# Altium schematic symbol library Capacitor - Aluminium TH.SchLib: 4591 symbols (part 4 of 27)
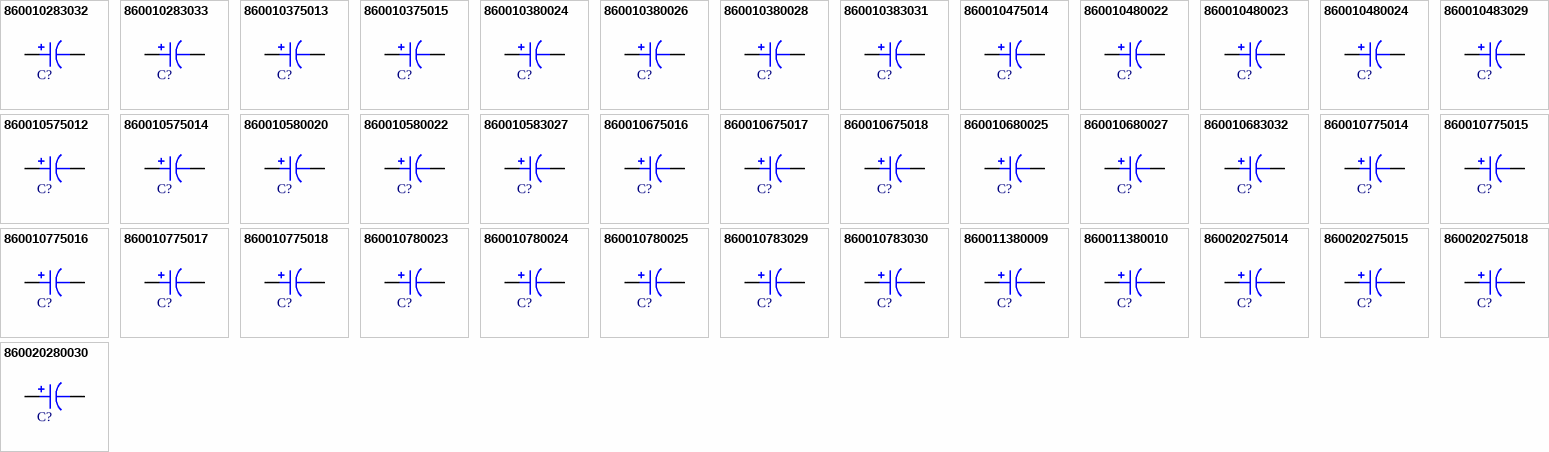
[diagram p117: symbols 860010283032 to 860020280030]

## 860010480022
designator C?, comment 2700uF  (value not drawn)
CAP 2700 UF 20% 25 V; Part Number: 860010480022; Manufacturer: Wurth Electronics Inc; TemperatureRange: -40C ~ 85C; Voltage: 25V; Type: Polar; Ripple Current: 1.804A @ 120Hz; Value: 2700uF; PartId: 26546; Supplier 1: Digi-Key; Supplier Part Number 1: 732-8645-3-ND; ComponentLink1Description: Datasheet; ComponentLink1URL: http://katalog.we-online.de/pbs/datasheet/860010480022.pdf; ComponentLink2Description: Digi-Key Listing; ComponentLink2URL: https://www.digikey.com/product-detail/en/wurth-electronics-inc/860010480022/732-8645-3-ND/5726893; Tolerance: 20%; Price: 1.0368; Device Package: Radial, Can, 16mm
footprint CAP AL TH D16 L7.5 H26.5
pins: 1, 2

## 860010480023
designator C?, comment 3300uF  (value not drawn)
CAP 3300 UF 20% 25 V; Part Number: 860010480023; Manufacturer: Wurth Electronics Inc; TemperatureRange: -40C ~ 85C; Voltage: 25V; Type: Polar; Ripple Current: 1.87A @ 120Hz; Value: 3300uF; PartId: 26547; Supplier 1: Digi-Key; Supplier Part Number 1: 732-8646-3-ND; ComponentLink1Description: Datasheet; ComponentLink1URL: http://katalog.we-online.de/pbs/datasheet/860010480023.pdf; ComponentLink2Description: Digi-Key Listing; ComponentLink2URL: https://www.digikey.com/product-detail/en/wurth-electronics-inc/860010480023/732-8646-3-ND/5726894; Tolerance: 20%; Price: 1.0397; Device Package: Radial, Can, 16mm
footprint CAP AL TH D16 L7.5 H26.5
pins: 1, 2

## 860010480024
designator C?, comment 3900uF  (value not drawn)
CAP 3900 UF 20% 25 V; Part Number: 860010480024; Manufacturer: Wurth Electronics Inc; TemperatureRange: -40C ~ 85C; Voltage: 25V; Type: Polar; Ripple Current: 2.343A @ 120Hz; Value: 3900uF; PartId: 27003; Supplier 1: Digi-Key; Supplier Part Number 1: 732-8647-3-ND; ComponentLink1Description: Datasheet; ComponentLink1URL: http://katalog.we-online.de/pbs/datasheet/860010480024.pdf; ComponentLink2Description: Digi-Key Listing; ComponentLink2URL: https://www.digikey.com/product-detail/en/wurth-electronics-inc/860010480024/732-8647-3-ND/5726895; Tolerance: 20%; Price: 1.3564; Device Package: Radial, Can, 16mm
footprint CAP AL TH D16 L7.5 H33.5
pins: 1, 2

## 860010483029
designator C?, comment 10000uF  (value not drawn)
CAP 10000 UF 20% 25 V; Part Number: 860010483029; Manufacturer: Wurth Electronics Inc; TemperatureRange: -40C ~ 85C; Voltage: 25V; Type: Polar; Ripple Current: 3.96A @ 120Hz; Value: 10000uF; PartId: 27598; Supplier 1: Digi-Key; Supplier Part Number 1: 732-8652-ND; ComponentLink1Description: Datasheet; ComponentLink1URL: http://katalog.we-online.de/pbs/datasheet/860010483029.pdf; ComponentLink2Description: Digi-Key Listing; ComponentLink2URL: https://www.digikey.com/product-detail/en/wurth-electronics-inc/860010483029/732-8652-ND/5728189; Tolerance: 20%; Price: 5.68; Device Package: Radial, Can, 22mm
footprint CAP AL TH D22 L10 H43
pins: 1, 2

## 860010575012
designator C?, comment 330uF  (value not drawn)
CAP 330 UF 20% 35 V; Part Number: 860010575012; Manufacturer: Wurth Electronics Inc; TemperatureRange: -40C ~ 85C; Voltage: 35V; Type: Polar; Ripple Current: 528mA @ 120Hz; Value: 330uF; PartId: 24732; Supplier 1: Digi-Key; Supplier Part Number 1: 732-8742-1-ND; ComponentLink1Description: Datasheet; ComponentLink1URL: http://katalog.we-online.de/pbs/datasheet/860010575012.pdf; ComponentLink2Description: Digi-Key Listing; ComponentLink2URL: https://www.digikey.com/product-detail/en/wurth-electronics-inc/860010575012/732-8742-1-ND/5728691; Tolerance: 20%; Price: 0.41; Device Package: Radial, Can, 10mm
footprint CAP AL TH D10 L5 H14.5
pins: 1, 2

## 860010575014
designator C?, comment 560uF  (value not drawn)
CAP 560 UF 20% 35 V; Part Number: 860010575014; Manufacturer: Wurth Electronics Inc; TemperatureRange: -40C ~ 85C; Voltage: 35V; Type: Polar; Ripple Current: 847mA @ 120Hz; Value: 560uF; PartId: 25488; Supplier 1: Digi-Key; Supplier Part Number 1: 732-8744-3-ND; ComponentLink1Description: Datasheet; ComponentLink1URL: http://katalog.we-online.de/pbs/datasheet/860010575014.pdf; ComponentLink2Description: Digi-Key Listing; ComponentLink2URL: https://www.digikey.com/product-detail/en/wurth-electronics-inc/860010575014/732-8744-3-ND/5726985; Tolerance: 20%; Price: 0.3603; Device Package: Radial, Can, 10mm
footprint CAP AL TH D10 L5 H22
pins: 1, 2

## 860010580020
designator C?, comment 1800uF  (value not drawn)
CAP 1800 UF 20% 35 V; Part Number: 860010580020; Manufacturer: Wurth Electronics Inc; TemperatureRange: -40C ~ 85C; Voltage: 35V; Type: Polar; Ripple Current: 1.749A @ 120Hz; Value: 1800uF; PartId: 26556; Supplier 1: Digi-Key; Supplier Part Number 1: 732-8750-3-ND; ComponentLink1Description: Datasheet; ComponentLink1URL: http://katalog.we-online.de/pbs/datasheet/860010580020.pdf; ComponentLink2Description: Digi-Key Listing; ComponentLink2URL: https://www.digikey.com/product-detail/en/wurth-electronics-inc/860010580020/732-8750-3-ND/5726991; Tolerance: 20%; Price: 1.0857; Device Package: Radial, Can, 16mm
footprint CAP AL TH D16 L7.5 H26.5
pins: 1, 2

## 860010580022
designator C?, comment 2700uF  (value not drawn)
CAP 2700 UF 20% 35 V; Part Number: 860010580022; Manufacturer: Wurth Electronics Inc; TemperatureRange: -40C ~ 85C; Voltage: 35V; Type: Polar; Ripple Current: 2.178A @ 120Hz; Value: 2700uF; PartId: 27042; Supplier 1: Digi-Key; Supplier Part Number 1: 732-8752-3-ND; ComponentLink1Description: Datasheet; ComponentLink1URL: http://katalog.we-online.de/pbs/datasheet/860010580022.pdf; ComponentLink2Description: Digi-Key Listing; ComponentLink2URL: https://www.digikey.com/product-detail/en/wurth-electronics-inc/860010580022/732-8752-3-ND/5726993; Tolerance: 20%; Price: 1.5436; Device Package: Radial, Can, 16mm
footprint CAP AL TH D16 L7.5 H33.5
pins: 1, 2

## 860010583027
designator C?, comment 6800uF  (value not drawn)
CAP 6800 UF 20% 35 V; Part Number: 860010583027; Manufacturer: Wurth Electronics Inc; TemperatureRange: -40C ~ 85C; Voltage: 35V; Type: Polar; Ripple Current: 3.63A @ 100kHz; Value: 6800uF; PartId: 27597; Supplier 1: Digi-Key; Supplier Part Number 1: 732-8757-ND; ComponentLink1Description: Datasheet; ComponentLink1URL: http://katalog.we-online.de/pbs/datasheet/860010583027.pdf; ComponentLink2Description: Digi-Key Listing; ComponentLink2URL: https://www.digikey.com/product-detail/en/wurth-electronics-inc/860010583027/732-8757-ND/5728197; Tolerance: 20%; Price: 5.2; Device Package: Radial, Can, 22mm
footprint CAP AL TH D22 L10 H43
pins: 1, 2

## 860010675016
designator C?, comment 150uF  (value not drawn)
CAP 150 UF 20% 50 V; Part Number: 860010675016; Manufacturer: Wurth Electronics Inc; TemperatureRange: -40C ~ 85C; Voltage: 50V; Type: Polar; Ripple Current: 363mA @ 120Hz; Value: 150uF; PartId: 24714; Supplier 1: Digi-Key; Supplier Part Number 1: 732-8668-1-ND; ComponentLink1Description: Datasheet; ComponentLink1URL: http://katalog.we-online.de/pbs/datasheet/860010675016.pdf; ComponentLink2Description: Digi-Key Listing; ComponentLink2URL: https://www.digikey.com/product-detail/en/wurth-electronics-inc/860010675016/732-8668-1-ND/5728623; Tolerance: 20%; Price: 0.39; Device Package: Radial, Can, 10mm
footprint CAP AL TH D10 L5 H14.5
pins: 1, 2

## 860010675017
designator C?, comment 180uF  (value not drawn)
CAP 180 UF 20% 50 V; Part Number: 860010675017; Manufacturer: Wurth Electronics Inc; TemperatureRange: -40C ~ 85C; Voltage: 50V; Type: Polar; Ripple Current: 418mA @ 120Hz; Value: 180uF; PartId: 24862; Supplier 1: Digi-Key; Supplier Part Number 1: 732-8669-1-ND; ComponentLink1Description: Datasheet; ComponentLink1URL: http://katalog.we-online.de/pbs/datasheet/860010675017.pdf; ComponentLink2Description: Digi-Key Listing; ComponentLink2URL: https://www.digikey.com/product-detail/en/wurth-electronics-inc/860010675017/732-8669-1-ND/5728624; Tolerance: 20%; Price: 0.47; Device Package: Radial, Can, 10mm
footprint CAP AL TH D10 L5 H14.5
pins: 1, 2

## 860010675018
designator C?, comment 220uF  (value not drawn)
CAP 220 UF 20% 50 V; Part Number: 860010675018; Manufacturer: Wurth Electronics Inc; TemperatureRange: -40C ~ 85C; Voltage: 50V; Type: Polar; Ripple Current: 468mA @ 120Hz; Value: 220uF; PartId: 24660; Supplier 1: Digi-Key; Supplier Part Number 1: 732-8670-3-ND; ComponentLink1Description: Datasheet; ComponentLink1URL: http://katalog.we-online.de/pbs/datasheet/860010675018.pdf; ComponentLink2Description: Digi-Key Listing; ComponentLink2URL: https://www.digikey.com/product-detail/en/wurth-electronics-inc/860010675018/732-8670-3-ND/5726917; Tolerance: 20%; Price: 0.2646; Device Package: Radial, Can, 10mm
footprint CAP AL TH D10 L5 H14.5
pins: 1, 2

## 860010680025
designator C?, comment 1200uF  (value not drawn)
CAP 1200 UF 20% 50 V; Part Number: 860010680025; Manufacturer: Wurth Electronics Inc; TemperatureRange: -40C ~ 85C; Voltage: 50V; Type: Polar; Ripple Current: 1.617A @ 120Hz; Value: 1200uF; PartId: 26646; Supplier 1: Digi-Key; Supplier Part Number 1: 732-8677-3-ND; ComponentLink1Description: Datasheet; ComponentLink1URL: http://katalog.we-online.de/pbs/datasheet/860010680025.pdf; ComponentLink2Description: Digi-Key Listing; ComponentLink2URL: https://www.digikey.com/product-detail/en/wurth-electronics-inc/860010680025/732-8677-3-ND/5726924; Tolerance: 20%; Price: 1.5321; Device Package: Radial, Can, 16mm
footprint CAP AL TH D16 L7.5 H26.5
pins: 1, 2

## 860010680027
designator C?, comment 1800uF  (value not drawn)
CAP 1800 UF 20% 50 V; Part Number: 860010680027; Manufacturer: Wurth Electronics Inc; TemperatureRange: -40C ~ 85C; Voltage: 50V; Type: Polar; Ripple Current: 2.112A @ 120Hz; Value: 1800uF; PartId: 27088; Supplier 1: Digi-Key; Supplier Part Number 1: 732-8679-3-ND; ComponentLink1Description: Datasheet; ComponentLink1URL: http://katalog.we-online.de/pbs/datasheet/860010680027.pdf; ComponentLink2Description: Digi-Key Listing; ComponentLink2URL: https://www.digikey.com/product-detail/en/wurth-electronics-inc/860010680027/732-8679-3-ND/5726926; Tolerance: 20%; Price: 1.7107; Device Package: Radial, Can, 16mm
footprint CAP AL TH D16 L7.5 H33.5
pins: 1, 2

## 860010683032
designator C?, comment 4700uF  (value not drawn)
CAP 4700 UF 20% 50 V; Part Number: 860010683032; Manufacturer: Wurth Electronics Inc; TemperatureRange: -40C ~ 85C; Voltage: 50V; Type: Polar; Ripple Current: 3.355A @ 120Hz; Value: 4700uF; PartId: 27601; Supplier 1: Digi-Key; Supplier Part Number 1: 732-8684-ND; ComponentLink1Description: Datasheet; ComponentLink1URL: http://katalog.we-online.de/pbs/datasheet/860010683032.pdf; ComponentLink2Description: Digi-Key Listing; ComponentLink2URL: https://www.digikey.com/product-detail/en/wurth-electronics-inc/860010683032/732-8684-ND/5728191; Tolerance: 20%; Price: 6.61; Device Package: Radial, Can, 22mm
footprint CAP AL TH D22 L10 H43
pins: 1, 2

## 860010775014
designator C?, comment 100uF  (value not drawn)
CAP 100 UF 20% 63 V; Part Number: 860010775014; Manufacturer: Wurth Electronics Inc; TemperatureRange: -40C ~ 85C; Voltage: 63V; Type: Polar; Ripple Current: 330mA @ 120Hz; Value: 100uF; PartId: 24717; Supplier 1: Digi-Key; Supplier Part Number 1: 732-8771-1-ND; ComponentLink1Description: Datasheet; ComponentLink1URL: http://katalog.we-online.de/pbs/datasheet/860010775014.pdf; ComponentLink2Description: Digi-Key Listing; ComponentLink2URL: https://www.digikey.com/product-detail/en/wurth-electronics-inc/860010775014/732-8771-1-ND/5728718; Tolerance: 20%; Price: 0.4; Device Package: Radial, Can, 10mm
footprint CAP AL TH D10 L5 H14.5
pins: 1, 2

## 860010775015
designator C?, comment 120uF  (value not drawn)
CAP 120 UF 20% 63 V; Part Number: 860010775015; Manufacturer: Wurth Electronics Inc; TemperatureRange: -40C ~ 85C; Voltage: 63V; Type: Polar; Ripple Current: 396mA @ 120Hz; Value: 120uF; PartId: 25120; Supplier 1: Digi-Key; Supplier Part Number 1: 732-8772-3-ND; ComponentLink1Description: Datasheet; ComponentLink1URL: http://katalog.we-online.de/pbs/datasheet/860010775015.pdf; ComponentLink2Description: Digi-Key Listing; ComponentLink2URL: https://www.digikey.com/product-detail/en/wurth-electronics-inc/860010775015/732-8772-3-ND/5727011; Tolerance: 20%; Price: 0.325; Device Package: Radial, Can, 10mm
footprint CAP AL TH D10 L5 H17.5
pins: 1, 2

## 860010775016
designator C?, comment 150uF  (value not drawn)
CAP 150 UF 20% 63 V; Part Number: 860010775016; Manufacturer: Wurth Electronics Inc; TemperatureRange: -40C ~ 85C; Voltage: 63V; Type: Polar; Ripple Current: 462mA @ 120Hz; Value: 150uF; PartId: 25127; Supplier 1: Digi-Key; Supplier Part Number 1: 732-8773-3-ND; ComponentLink1Description: Datasheet; ComponentLink1URL: http://katalog.we-online.de/pbs/datasheet/860010775016.pdf; ComponentLink2Description: Digi-Key Listing; ComponentLink2URL: https://www.digikey.com/product-detail/en/wurth-electronics-inc/860010775016/732-8773-3-ND/5727012; Tolerance: 20%; Price: 0.3402; Device Package: Radial, Can, 10mm
footprint CAP AL TH D10 L5 H17.5
pins: 1, 2

## 860010775017
designator C?, comment 180uF  (value not drawn)
CAP 180 UF 20% 63 V; Part Number: 860010775017; Manufacturer: Wurth Electronics Inc; TemperatureRange: -40C ~ 85C; Voltage: 63V; Type: Polar; Ripple Current: 528mA @ 120Hz; Value: 180uF; PartId: 25132; Supplier 1: Digi-Key; Supplier Part Number 1: 732-8774-3-ND; ComponentLink1Description: Datasheet; ComponentLink1URL: http://katalog.we-online.de/pbs/datasheet/860010775017.pdf; ComponentLink2Description: Digi-Key Listing; ComponentLink2URL: https://www.digikey.com/product-detail/en/wurth-electronics-inc/860010775017/732-8774-3-ND/5727013; Tolerance: 20%; Price: 0.3502; Device Package: Radial, Can, 10mm
footprint CAP AL TH D10 L5 H17.5
pins: 1, 2

## 860010775018
designator C?, comment 220uF  (value not drawn)
CAP 220 UF 20% 63 V; Part Number: 860010775018; Manufacturer: Wurth Electronics Inc; TemperatureRange: -40C ~ 85C; Voltage: 63V; Type: Polar; Ripple Current: 550mA @ 120Hz; Value: 220uF; PartId: 25138; Supplier 1: Digi-Key; Supplier Part Number 1: 732-8775-3-ND; ComponentLink1Description: Datasheet; ComponentLink1URL: http://katalog.we-online.de/pbs/datasheet/860010775018.pdf; ComponentLink2Description: Digi-Key Listing; ComponentLink2URL: https://www.digikey.com/product-detail/en/wurth-electronics-inc/860010775018/732-8775-3-ND/5727014; Tolerance: 20%; Price: 0.3754; Device Package: Radial, Can, 10mm
footprint CAP AL TH D10 L5 H17.5
pins: 1, 2

## 860010780023
designator C?, comment 820uF  (value not drawn)
CAP 820 UF 20% 63 V; Part Number: 860010780023; Manufacturer: Wurth Electronics Inc; TemperatureRange: -40C ~ 85C; Voltage: 63V; Type: Polar; Ripple Current: 1.43A @ 120Hz; Value: 820uF; PartId: 26637; Supplier 1: Digi-Key; Supplier Part Number 1: 732-8780-3-ND; ComponentLink1Description: Datasheet; ComponentLink1URL: http://katalog.we-online.de/pbs/datasheet/860010780023.pdf; ComponentLink2Description: Digi-Key Listing; ComponentLink2URL: https://www.digikey.com/product-detail/en/wurth-electronics-inc/860010780023/732-8780-3-ND/5727019; Tolerance: 20%; Price: 1.4832; Device Package: Radial, Can, 16mm
footprint CAP AL TH D16 L7.5 H26.5
pins: 1, 2

## 860010780024
designator C?, comment 1000uF  (value not drawn)
CAP 1000 UF 20% 63 V; Part Number: 860010780024; Manufacturer: Wurth Electronics Inc; TemperatureRange: -40C ~ 85C; Voltage: 63V; Type: Polar; Ripple Current: 1.54A @ 120Hz; Value: 1000uF; PartId: 26644; Supplier 1: Digi-Key; Supplier Part Number 1: 732-8781-3-ND; ComponentLink1Description: Datasheet; ComponentLink1URL: http://katalog.we-online.de/pbs/datasheet/860010780024.pdf; ComponentLink2Description: Digi-Key Listing; ComponentLink2URL: https://www.digikey.com/product-detail/en/wurth-electronics-inc/860010780024/732-8781-3-ND/5727020; Tolerance: 20%; Price: 1.5293; Device Package: Radial, Can, 16mm
footprint CAP AL TH D16 L7.5 H26.5
pins: 1, 2

## 860010780025
designator C?, comment 1200uF  (value not drawn)
CAP 1200 UF 20% 63 V; Part Number: 860010780025; Manufacturer: Wurth Electronics Inc; TemperatureRange: -40C ~ 85C; Voltage: 63V; Type: Polar; Ripple Current: 1.837A @ 120Hz; Value: 1200uF; PartId: 27156; Supplier 1: Digi-Key; Supplier Part Number 1: 732-8782-3-ND; ComponentLink1Description: Datasheet; ComponentLink1URL: http://katalog.we-online.de/pbs/datasheet/860010780025.pdf; ComponentLink2Description: Digi-Key Listing; ComponentLink2URL: https://www.digikey.com/product-detail/en/wurth-electronics-inc/860010780025/732-8782-3-ND/5727021; Tolerance: 20%; Price: 1.8662; Device Package: Radial, Can, 16mm
footprint CAP AL TH D16 L7.5 H33.5
pins: 1, 2

## 860010783029
designator C?, comment 2700uF  (value not drawn)
CAP 2700 UF 20% 63 V; Part Number: 860010783029; Manufacturer: Wurth Electronics Inc; TemperatureRange: -40C ~ 85C; Voltage: 63V; Type: Polar; Ripple Current: 2.86A @ 120Hz; Value: 2700uF; PartId: 27602; Supplier 1: Digi-Key; Supplier Part Number 1: 732-8786-ND; ComponentLink1Description: Datasheet; ComponentLink1URL: http://katalog.we-online.de/pbs/datasheet/860010783029.pdf; ComponentLink2Description: Digi-Key Listing; ComponentLink2URL: https://www.digikey.com/product-detail/en/wurth-electronics-inc/860010783029/732-8786-ND/5728198; Tolerance: 20%; Price: 6.65; Device Package: Radial, Can, 22mm
footprint CAP AL TH D22 L10 H43
pins: 1, 2

## 860010783030
designator C?, comment 3300uF  (value not drawn)
CAP 3300 UF 20% 63 V; Part Number: 860010783030; Manufacturer: Wurth Electronics Inc; TemperatureRange: -40C ~ 85C; Voltage: 63V; Type: Polar; Ripple Current: 3.08A @ 120Hz; Value: 3300uF; PartId: 27603; Supplier 1: Digi-Key; Supplier Part Number 1: 732-8787-ND; ComponentLink1Description: Datasheet; ComponentLink1URL: http://katalog.we-online.de/pbs/datasheet/860010783030.pdf; ComponentLink2Description: Digi-Key Listing; ComponentLink2URL: https://www.digikey.com/product-detail/en/wurth-electronics-inc/860010783030/732-8787-ND/5728199; Tolerance: 20%; Price: 6.98; Device Package: Radial, Can, 22mm
footprint CAP AL TH D22 L10 H43
pins: 1, 2

## 860011380009
designator C?, comment 47uF  (value not drawn)
CAP 47 UF 20% 400 V; Part Number: 860011380009; Manufacturer: Wurth Electronics Inc; TemperatureRange: -25C ~ 85C; Voltage: 400V; Type: Polar; Ripple Current: 270mA @ 120Hz; Value: 47uF; PartId: 26652; Supplier 1: Digi-Key; Supplier Part Number 1: 732-8693-3-ND; ComponentLink1Description: Datasheet; ComponentLink1URL: http://katalog.we-online.de/pbs/datasheet/860011380009.pdf; ComponentLink2Description: Digi-Key Listing; ComponentLink2URL: https://www.digikey.com/product-detail/en/wurth-electronics-inc/860011380009/732-8693-3-ND/5726938; Tolerance: 20%; Price: 1.5523; Device Package: Radial, Can, 16mm
footprint CAP AL TH D16 L7.5 H26.5
pins: 1, 2

## 860011380010
designator C?, comment 68uF  (value not drawn)
CAP 68 UF 20% 400 V; Part Number: 860011380010; Manufacturer: Wurth Electronics Inc; TemperatureRange: -25C ~ 85C; Voltage: 400V; Type: Polar; Ripple Current: 410mA @ 120Hz; Value: 68uF; PartId: 27412; Supplier 1: Digi-Key; Supplier Part Number 1: 732-8694-3-ND; ComponentLink1Description: Datasheet; ComponentLink1URL: http://katalog.we-online.de/pbs/datasheet/860011380010.pdf; ComponentLink2Description: Digi-Key Listing; ComponentLink2URL: https://www.digikey.com/product-detail/en/wurth-electronics-inc/860011380010/732-8694-3-ND/5726939; Tolerance: 20%; Price: 2.4163; Device Package: Radial, Can, 16mm
footprint CAP AL TH D16 L7.5 H37
pins: 1, 2

## 860020275014
designator C?, comment 820uF  (value not drawn)
CAP ALUM 820UF 20% 10V RADIAL; Part Number: 860020275014; Manufacturer: Wurth Electronics Inc; TemperatureRange: -40C ~ 105C; Type: Polar; Ripple Current: 480mA @ 120Hz; Value: 820uF; PartId: 24691; Supplier 1: Digi-Key; Supplier Part Number 1: 732-8916-1-ND; ComponentLink1Description: Datasheet; ComponentLink1URL: http://katalog.we-online.de/pbs/datasheet/860020275014.pdf; ComponentLink2Description: Digi-Key Listing; ComponentLink2URL: https://www.digikey.com/product-detail/en/wurth-electronics-inc/860020275014/732-8916-1-ND/5728859; Tolerance: 20%; Voltage: 10V; Price: 0.35; Device Package: Radial, Can, 10mm
footprint CAP AL TH D10 L5 H14.5
pins: 1, 2

## 860020275015
designator C?, comment 1000uF  (value not drawn)
CAP ALUM 1000UF 20% 10V RADIAL; Part Number: 860020275015; Manufacturer: Wurth Electronics Inc; TemperatureRange: -40C ~ 105C; Type: Polar; Ripple Current: 520mA @ 120Hz; Value: 1000uF; PartId: 24707; Supplier 1: Digi-Key; Supplier Part Number 1: 732-8917-1-ND; ComponentLink1Description: Datasheet; ComponentLink1URL: http://katalog.we-online.de/pbs/datasheet/860020275015.pdf; ComponentLink2Description: Digi-Key Listing; ComponentLink2URL: https://www.digikey.com/product-detail/en/wurth-electronics-inc/860020275015/732-8917-1-ND/5728860; Tolerance: 20%; Voltage: 10V; Price: 0.38; Device Package: Radial, Can, 10mm
footprint CAP AL TH D10 L5 H14.5
pins: 1, 2

## 860020275018
designator C?, comment 1500uF  (value not drawn)
CAP ALUM 1500UF 20% 10V RADIAL; Part Number: 860020275018; Manufacturer: Wurth Electronics Inc; TemperatureRange: -40C ~ 105C; Type: Polar; Ripple Current: 770mA @ 120Hz; Value: 1500uF; PartId: 25102; Supplier 1: Digi-Key; Supplier Part Number 1: 732-8920-3-ND; ComponentLink1Description: Datasheet; ComponentLink1URL: http://katalog.we-online.de/pbs/datasheet/860020275018.pdf; ComponentLink2Description: Digi-Key Listing; ComponentLink2URL: https://www.digikey.com/product-detail/en/wurth-electronics-inc/860020275018/732-8920-3-ND/5727155; Tolerance: 20%; Voltage: 10V; Price: 0.2872; Device Package: Radial, Can, 10mm
footprint CAP AL TH D10 L5 H17.5
pins: 1, 2

## 860020280030
designator C?, comment 12000uF  (value not drawn)
CAP ALUM 12000UF 20% 10V RADIAL; Part Number: 860020280030; Manufacturer: Wurth Electronics Inc; TemperatureRange: -40C ~ 105C; Type: Polar; Ripple Current: 2.05A @ 120Hz; Value: 12000uF; PartId: 27416; Supplier 1: Digi-Key; Supplier Part Number 1: 732-8932-3-ND; ComponentLink1Description: Datasheet; ComponentLink1URL: http://katalog.we-online.de/pbs/datasheet/860020280030.pdf; ComponentLink2Description: Digi-Key Listing; ComponentLink2URL: https://www.digikey.com/product-detail/en/wurth-electronics-inc/860020280030/732-8932-3-ND/5727167; Tolerance: 20%; Voltage: 10V; Price: 2.5545; Device Package: Radial, Can, 16mm
footprint CAP AL TH D16 L7.5 H37
pins: 1, 2

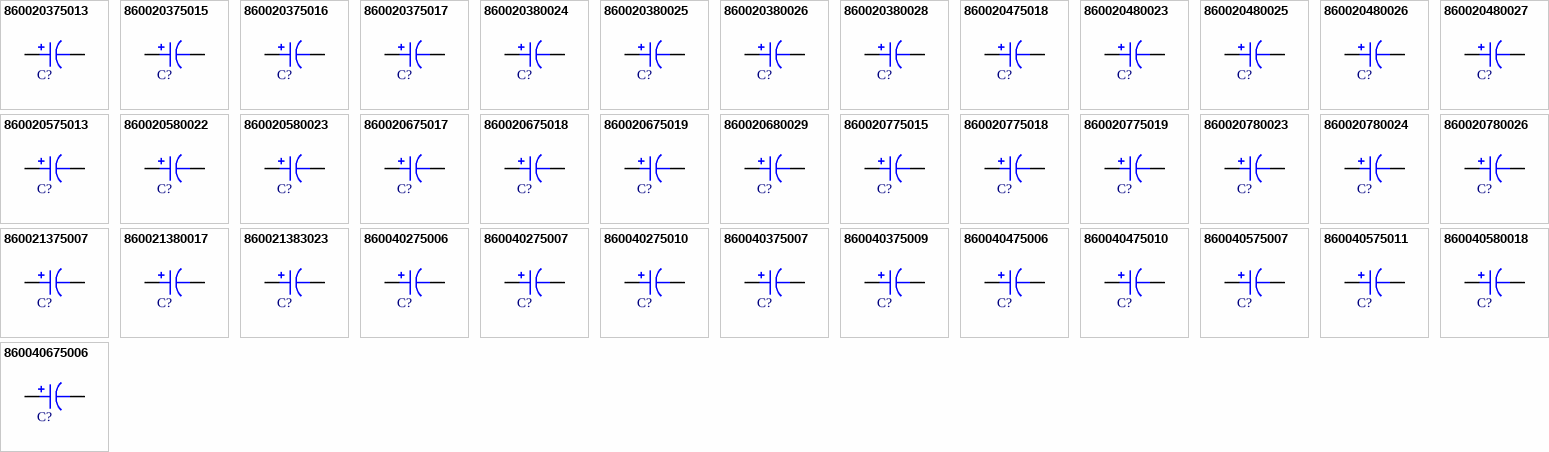
[diagram p14: symbols 860020375013 to 860040675006]

## 860020375013
designator C?, comment 560uF  (value not drawn)
CAP ALUM 560UF 20% 16V RADIAL; Part Number: 860020375013; Manufacturer: Wurth Electronics Inc; TemperatureRange: -40C ~ 105C; Type: Polar; Ripple Current: 410mA @ 120Hz; Value: 560uF; PartId: 24705; Supplier 1: Digi-Key; Supplier Part Number 1: 732-8800-1-ND; ComponentLink1Description: Datasheet; ComponentLink1URL: http://katalog.we-online.de/pbs/datasheet/860020375013.pdf; ComponentLink2Description: Digi-Key Listing; ComponentLink2URL: https://www.digikey.com/product-detail/en/wurth-electronics-inc/860020375013/732-8800-1-ND/5728745; Tolerance: 20%; Voltage: 16V; Price: 0.38; Device Package: Radial, Can, 10mm
footprint CAP AL TH D10 L5 H14.5
pins: 1, 2

## 860020375015
designator C?, comment 680uF  (value not drawn)
CAP ALUM 680UF 20% 16V RADIAL; Part Number: 860020375015; Manufacturer: Wurth Electronics Inc; TemperatureRange: -40C ~ 105C; Type: Polar; Ripple Current: 480mA @ 120Hz; Value: 680uF; PartId: 24706; Supplier 1: Digi-Key; Supplier Part Number 1: 732-8802-1-ND; ComponentLink1Description: Datasheet; ComponentLink1URL: http://katalog.we-online.de/pbs/datasheet/860020375015.pdf; ComponentLink2Description: Digi-Key Listing; ComponentLink2URL: https://www.digikey.com/product-detail/en/wurth-electronics-inc/860020375015/732-8802-1-ND/5728747; Tolerance: 20%; Voltage: 16V; Price: 0.38; Device Package: Radial, Can, 10mm
footprint CAP AL TH D10 L5 H14.5
pins: 1, 2

## 860020375016
designator C?, comment 820uF  (value not drawn)
CAP ALUM 820UF 20% 16V RADIAL; Part Number: 860020375016; Manufacturer: Wurth Electronics Inc; TemperatureRange: -40C ~ 105C; Type: Polar; Ripple Current: 550mA @ 120Hz; Value: 820uF; PartId: 25085; Supplier 1: Digi-Key; Supplier Part Number 1: 732-8803-3-ND; ComponentLink1Description: Datasheet; ComponentLink1URL: http://katalog.we-online.de/pbs/datasheet/860020375016.pdf; ComponentLink2Description: Digi-Key Listing; ComponentLink2URL: https://www.digikey.com/product-detail/en/wurth-electronics-inc/860020375016/732-8803-3-ND/5727040; Tolerance: 20%; Voltage: 16V; Price: 0.2444; Device Package: Radial, Can, 10mm
footprint CAP AL TH D10 L5 H17.5
pins: 1, 2

## 860020375017
designator C?, comment 1000uF  (value not drawn)
CAP ALUM 1000UF 20% 16V RADIAL; Part Number: 860020375017; Manufacturer: Wurth Electronics Inc; TemperatureRange: -40C ~ 105C; Type: Polar; Ripple Current: 540mA @ 120Hz; Value: 1000uF; PartId: 24792; Supplier 1: Digi-Key; Supplier Part Number 1: 732-8804-1-ND; ComponentLink1Description: Datasheet; ComponentLink1URL: http://katalog.we-online.de/pbs/datasheet/860020375017.pdf; ComponentLink2Description: Digi-Key Listing; ComponentLink2URL: https://www.digikey.com/product-detail/en/wurth-electronics-inc/860020375017/732-8804-1-ND/5728749; Tolerance: 20%; Voltage: 16V; Price: 0.44; Device Package: Radial, Can, 10mm
footprint CAP AL TH D10 L5 H14.5
pins: 1, 2

## 860020380024
designator C?, comment 3900uF  (value not drawn)
CAP ALUM 3900UF 20% 16V RADIAL; Part Number: 860020380024; Manufacturer: Wurth Electronics Inc; TemperatureRange: -40C ~ 105C; Type: Polar; Ripple Current: 1.49A @ 120Hz; Value: 3900uF; PartId: 26529; Supplier 1: Digi-Key; Supplier Part Number 1: 732-8811-3-ND; ComponentLink1Description: Datasheet; ComponentLink1URL: http://katalog.we-online.de/pbs/datasheet/860020380024.pdf; ComponentLink2Description: Digi-Key Listing; ComponentLink2URL: https://www.digikey.com/product-detail/en/wurth-electronics-inc/860020380024/732-8811-3-ND/5727048; Tolerance: 20%; Voltage: 16V; Price: 0.9216; Device Package: Radial, Can, 16mm
footprint CAP AL TH D16 L7.5 H26.5
pins: 1, 2

## 860020380025
designator C?, comment 4700uF  (value not drawn)
CAP ALUM 4700UF 20% 16V RADIAL; Part Number: 860020380025; Manufacturer: Wurth Electronics Inc; TemperatureRange: -40C ~ 105C; Type: Polar; Ripple Current: 1.6A @ 120Hz; Value: 4700uF; PartId: 26549; Supplier 1: Digi-Key; Supplier Part Number 1: 732-8812-3-ND; ComponentLink1Description: Datasheet; ComponentLink1URL: http://katalog.we-online.de/pbs/datasheet/860020380025.pdf; ComponentLink2Description: Digi-Key Listing; ComponentLink2URL: https://www.digikey.com/product-detail/en/wurth-electronics-inc/860020380025/732-8812-3-ND/5727049; Tolerance: 20%; Voltage: 16V; Price: 1.0425; Device Package: Radial, Can, 16mm
footprint CAP AL TH D16 L7.5 H26.5
pins: 1, 2

## 860020380026
designator C?, comment 5600uF  (value not drawn)
CAP ALUM 5600UF 20% 16V RADIAL; Part Number: 860020380026; Manufacturer: Wurth Electronics Inc; TemperatureRange: -40C ~ 105C; Type: Polar; Ripple Current: 1.72A @ 120Hz; Value: 5600uF; PartId: 27005; Supplier 1: Digi-Key; Supplier Part Number 1: 732-8813-3-ND; ComponentLink1Description: Datasheet; ComponentLink1URL: http://katalog.we-online.de/pbs/datasheet/860020380026.pdf; ComponentLink2Description: Digi-Key Listing; ComponentLink2URL: https://www.digikey.com/product-detail/en/wurth-electronics-inc/860020380026/732-8813-3-ND/5727050; Tolerance: 20%; Voltage: 16V; Price: 1.3795; Device Package: Radial, Can, 16mm
footprint CAP AL TH D16 L7.5 H33.5
pins: 1, 2

## 860020380028
designator C?, comment 8200uF  (value not drawn)
CAP ALUM 8200UF 20% 16V RADIAL; Part Number: 860020380028; Manufacturer: Wurth Electronics Inc; TemperatureRange: -40C ~ 105C; Type: Polar; Ripple Current: 2.02A @ 120Hz; Value: 8200uF; PartId: 27331; Supplier 1: Digi-Key; Supplier Part Number 1: 732-8815-3-ND; ComponentLink1Description: Datasheet; ComponentLink1URL: http://katalog.we-online.de/pbs/datasheet/860020380028.pdf; ComponentLink2Description: Digi-Key Listing; ComponentLink2URL: https://www.digikey.com/product-detail/en/wurth-electronics-inc/860020380028/732-8815-3-ND/5727052; Tolerance: 20%; Voltage: 16V; Price: 1.6128; Device Package: Radial, Can, 16mm
footprint CAP AL TH D16 L7.5 H37
pins: 1, 2

## 860020475018
designator C?, comment 1000uF  (value not drawn)
CAP ALUM 1000UF 20% 25V RADIAL; Part Number: 860020475018; Manufacturer: Wurth Electronics Inc; TemperatureRange: -40C ~ 105C; Type: Polar; Ripple Current: 710mA @ 120Hz; Value: 1000uF; PartId: 25482; Supplier 1: Digi-Key; Supplier Part Number 1: 732-8835-3-ND; ComponentLink1Description: Datasheet; ComponentLink1URL: http://katalog.we-online.de/pbs/datasheet/860020475018.pdf; ComponentLink2Description: Digi-Key Listing; ComponentLink2URL: https://www.digikey.com/product-detail/en/wurth-electronics-inc/860020475018/732-8835-3-ND/5727072; Tolerance: 20%; Voltage: 25V; Price: 0.3301; Device Package: Radial, Can, 10mm
footprint CAP AL TH D10 L5 H22
pins: 1, 2

## 860020480023
designator C?, comment 2700uF  (value not drawn)